# Altium schematic symbol library SparkFun.SCHLIB: 796 symbols (part 1 of 5) (continued)
## AVR-MEGA8-PSIM (continued)

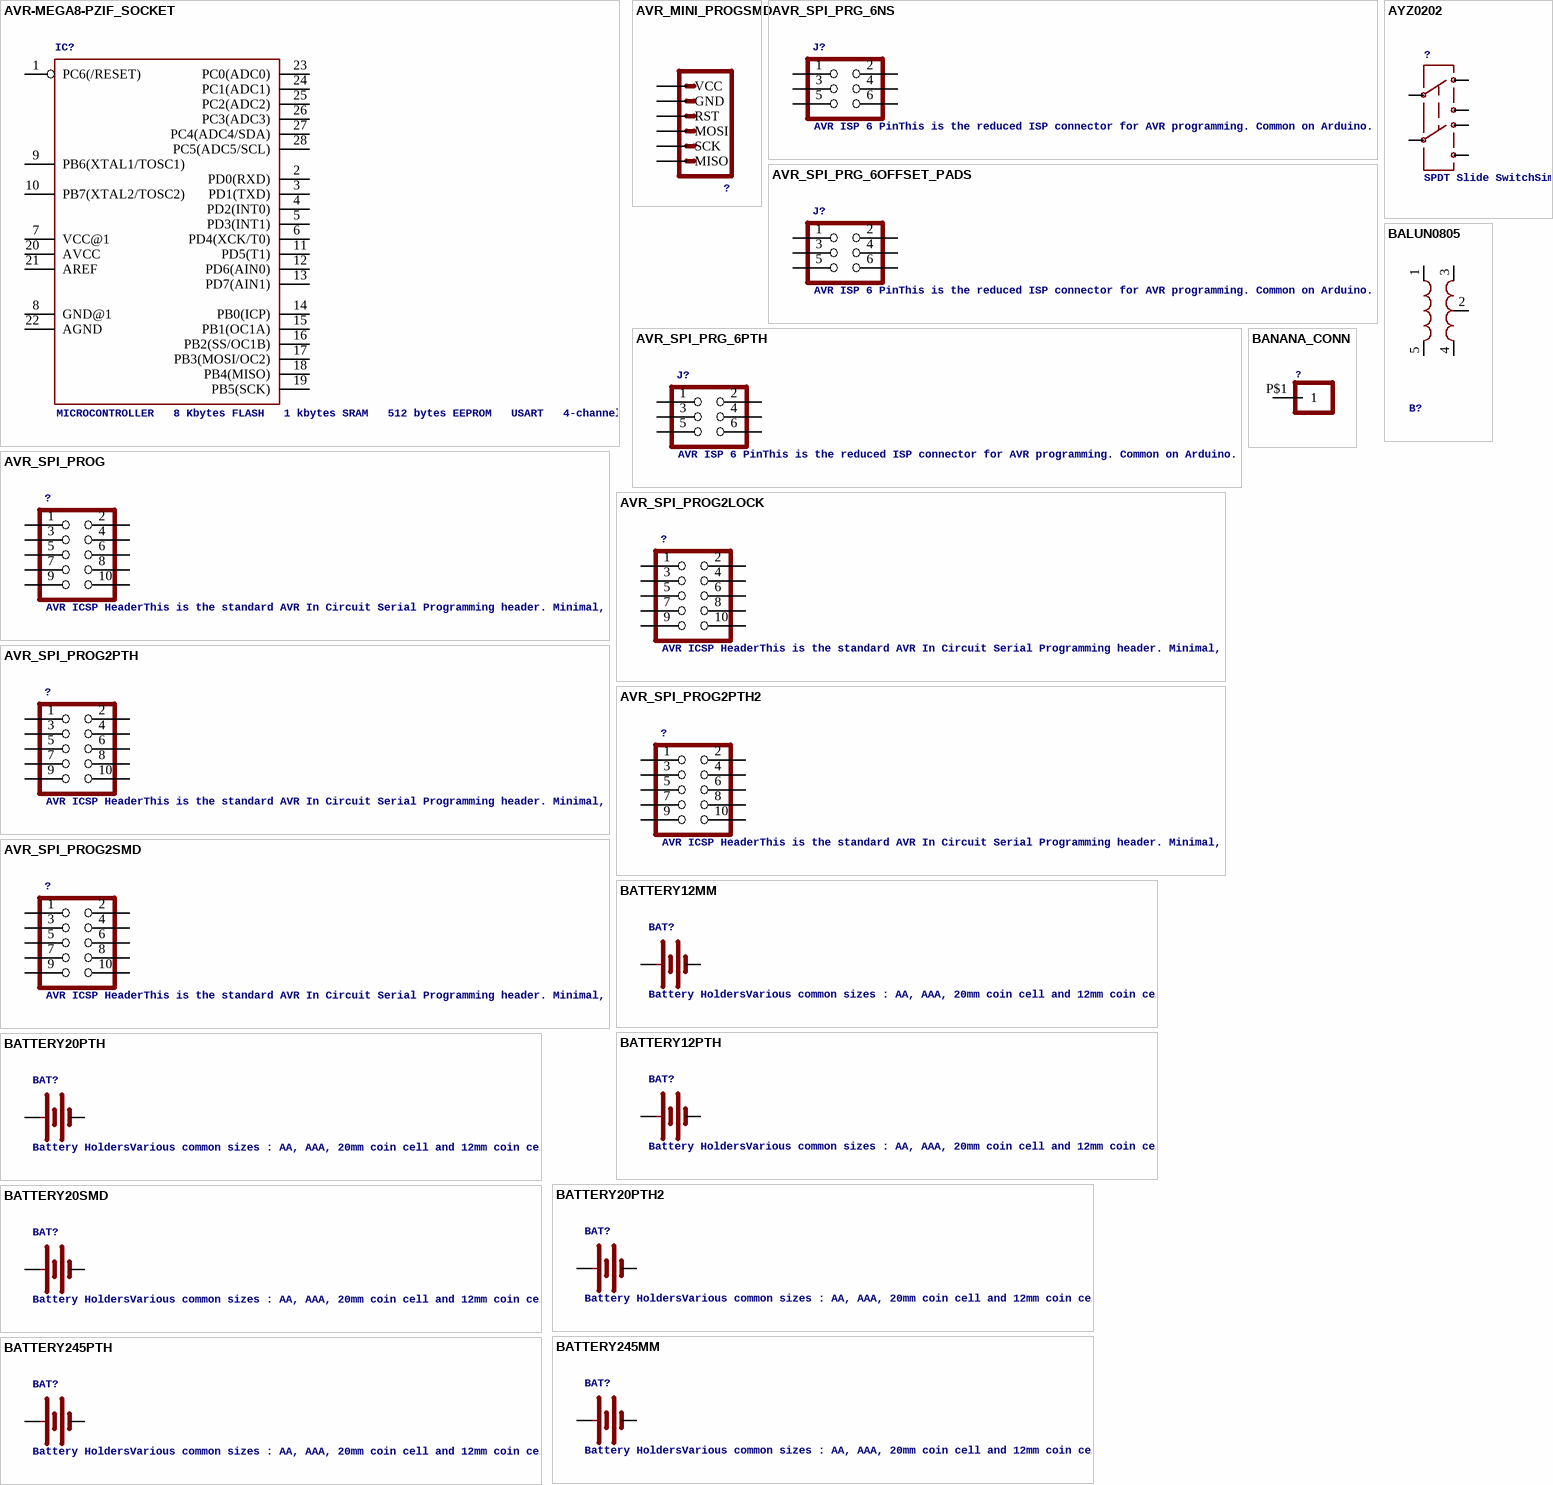
[diagram p4: symbols AVR-MEGA8-PZIF_SOCKET to BATTERY245PTH]

## AVR-MEGA8-PZIF_SOCKET
designator IC?, comment MICROCONTROLLER   8 Kbytes FLASH   1 kbytes SRAM   512 bytes EEPROM   USART   4-channel 10 bit ADC   2-channel 8 bit ADC
footprint DIL28-3-ZIF_SOCKET
pins: 1 PC6(/RESET), 2 PD0(RXD), 3 PD1(TXD), 4 PD2(INT0), 5 PD3(INT1), 6 PD4(XCK/T0), 7 VCC@1, 8 GND@1, 9 PB6(XTAL1/TOSC1), 10 PB7(XTAL2/TOSC2), 11 PD5(T1), 12 PD6(AIN0), 13 PD7(AIN1), 14 PB0(ICP), 15 PB1(OC1A), 16 PB2(SS/OC1B), 17 PB3(MOSI/OC2), 18 PB4(MISO), 19 PB5(SCK), 20 AVCC, 21 AREF, 22 AGND, 23 PC0(ADC0), 24 PC1(ADC1), 25 PC2(ADC2), 26 PC3(ADC3), 27 PC4(ADC4/SDA), 28 PC5(ADC5/SCL)

## AVR_MINI_PROGSMD
designator ?
footprint AVR_MINI_PROG
pins: 1 VCC, 2 GND, 3 RST, 4 MOSI, 5 SCK, 6 MISO

## AVR_SPI_PRG_6NS
designator J?, comment AVR ISP 6 PinThis is the reduced ISP connector for AVR programming. Common on Arduino. This footprint will take up less PCB space and can be used with a 10-pin to 6-pin adapter such as SKU: BOB-08508
footprint 2X3-NS
pins: 1, 2, 3, 4, 5, 6

## AVR_SPI_PRG_6OFFSET_PADS
designator J?, comment AVR ISP 6 PinThis is the reduced ISP connector for AVR programming. Common on Arduino. This footprint will take up less PCB space and can be used with a 10-pin to 6-pin adapter such as SKU: BOB-08508
footprint 2X3_OFFSET
pins: 1, 2, 3, 4, 5, 6

## AVR_SPI_PRG_6PTH
designator J?, comment AVR ISP 6 PinThis is the reduced ISP connector for AVR programming. Common on Arduino. This footprint will take up less PCB space and can be used with a 10-pin to 6-pin adapter such as SKU: BOB-08508
footprint 2X3
pins: 1, 2, 3, 4, 5, 6

## AVR_SPI_PROG
designator ?, comment AVR ICSP HeaderThis is the standard AVR In Circuit Serial Programming header. Minimal, but includes pin one indicator. Works with standard Olimex programmers. Also look for the 6-pin reduced version. Spark Fun Electronics SKU: PRT-00778
footprint AVR_ICSP
pins: 1, 2, 3, 4, 5, 6, 7, 8, 9, 10

## AVR_SPI_PROG2LOCK
designator ?, comment AVR ICSP HeaderThis is the standard AVR In Circuit Serial Programming header. Minimal, but includes pin one indicator. Works with standard Olimex programmers. Also look for the 6-pin reduced version. Spark Fun Electronics SKU: PRT-00778
footprint 2X5-SHROUDED_LOCK
pins: 1, 2, 3, 4, 5, 6, 7, 8, 9, 10

## AVR_SPI_PROG2PTH
designator ?, comment AVR ICSP HeaderThis is the standard AVR In Circuit Serial Programming header. Minimal, but includes pin one indicator. Works with standard Olimex programmers. Also look for the 6-pin reduced version. Spark Fun Electronics SKU: PRT-00778
footprint AVR_ICSP
pins: 1, 2, 3, 4, 5, 6, 7, 8, 9, 10

## AVR_SPI_PROG2PTH2
designator ?, comment AVR ICSP HeaderThis is the standard AVR In Circuit Serial Programming header. Minimal, but includes pin one indicator. Works with standard Olimex programmers. Also look for the 6-pin reduced version. Spark Fun Electronics SKU: PRT-00778
footprint 2X5-SHROUDED
pins: 1, 2, 3, 4, 5, 6, 7, 8, 9, 10

## AVR_SPI_PROG2SMD
designator ?, comment AVR ICSP HeaderThis is the standard AVR In Circuit Serial Programming header. Minimal, but includes pin one indicator. Works with standard Olimex programmers. Also look for the 6-pin reduced version. Spark Fun Electronics SKU: PRT-00778
footprint 2X5-SHROUDED_SMD
pins: 1, 2, 3, 4, 5, 6, 7, 8, 9, 10

## AYZ0202
designator ?, comment SPDT Slide SwitchSimple SMD single-pull double-throw slide switch. Good for  less than 350mA power switch, switching UARTs between devices, etc. Spark Fun Electronics SKU : COM-00597
footprint AYZ0202
pins: 1 3, 2, 3 1, 4 6, 5, 6 4

## BALUN0805
designator B?
footprint BALUN
pins: 1 IN, 2 GND@2, 3 OUT1, 4 OUT2, 5 GND@5

## BANANA_CONN
designator ?
footprint BANANA_CONN
pins: P$1 1

## BATTERY12MM
designator BAT?, comment Battery HoldersVarious common sizes : AA, AAA, 20mm coin cell and 12mm coin cell.
footprint BATTCON_12MM
pins: GND - (power), PWR@1 + (power)

## BATTERY12PTH
designator BAT?, comment Battery HoldersVarious common sizes : AA, AAA, 20mm coin cell and 12mm coin cell.
footprint BATTCON_12MM_PTH
pins: GND - (power), VCC@1 + (power)

## BATTERY20PTH
designator BAT?, comment Battery HoldersVarious common sizes : AA, AAA, 20mm coin cell and 12mm coin cell.
footprint BATTCOM_20MM_PTH
pins: 1 + (power), 2 - (power)

## BATTERY20PTH2
designator BAT?, comment Battery HoldersVarious common sizes : AA, AAA, 20mm coin cell and 12mm coin cell.
footprint BATTERY
pins: + (power), - (power)

## BATTERY20SMD
designator BAT?, comment Battery HoldersVarious common sizes : AA, AAA, 20mm coin cell and 12mm coin cell.
footprint BATTCON_20MM
pins: 1 + (power), 2 - (power)

## BATTERY245MM
designator BAT?, comment Battery HoldersVarious common sizes : AA, AAA, 20mm coin cell and 12mm coin cell.
footprint BATTCON_245MM
pins: 1 + (power), 2 - (power)

## BATTERY245PTH
designator BAT?, comment Battery HoldersVarious common sizes : AA, AAA, 20mm coin cell and 12mm coin cell.
footprint BATTCON_245MM_PTH
pins: 2 - (power), 3 + (power)

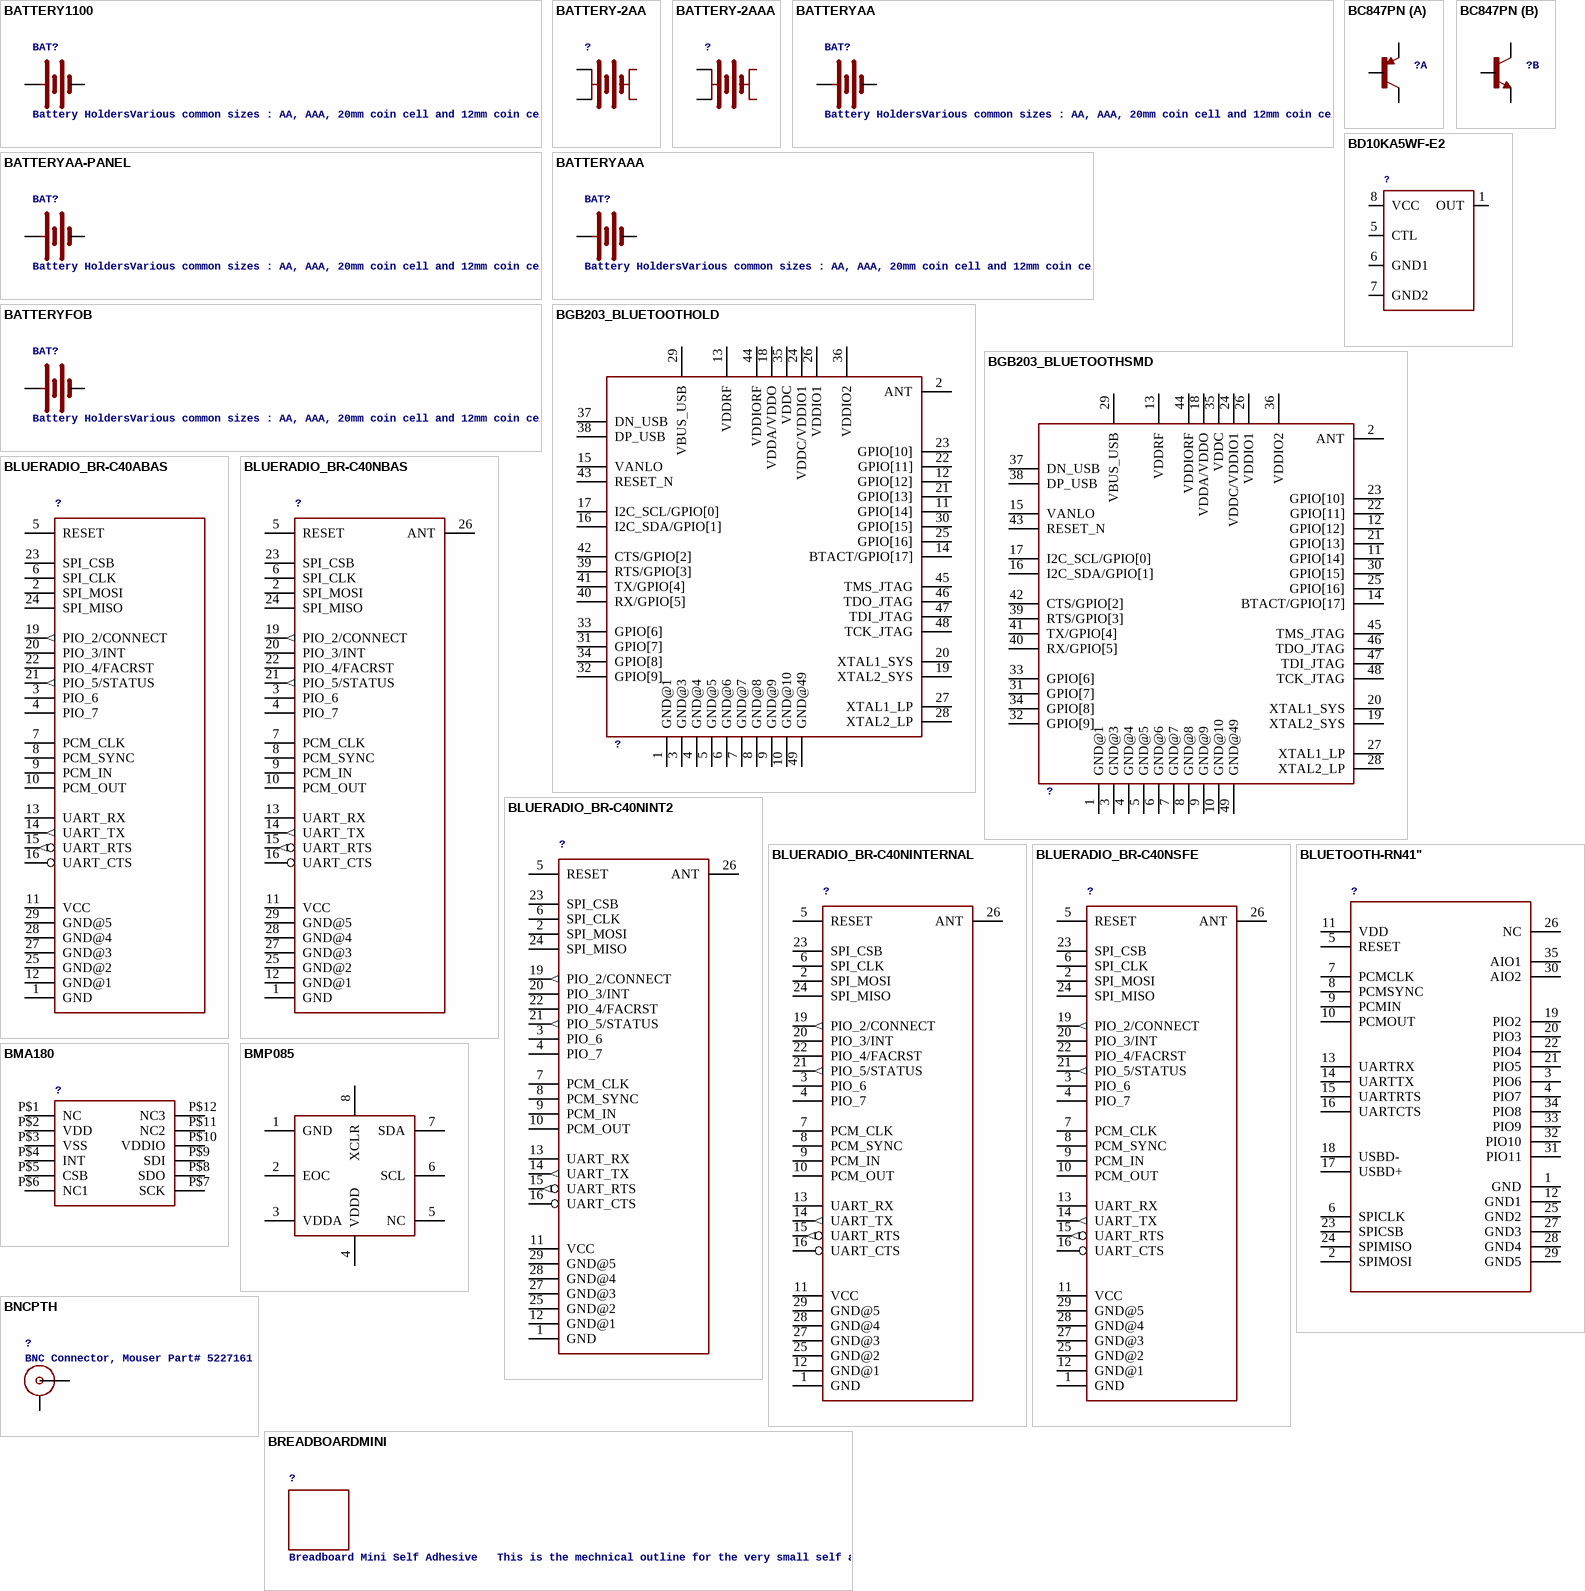
[diagram p5: symbols BATTERY1100 to BREADBOARDMINI]

## BATTERY1100
designator BAT?, comment Battery HoldersVarious common sizes : AA, AAA, 20mm coin cell and 12mm coin cell.
footprint LIPO-1100MAH
pins: + (power), - (power)

## BATTERY-2AA
designator ?
footprint BATTERY-AA
pins: GND@1 -1 (power), GND@2 -2 (power), PWR@1 +1 (power), PWR@2 +2 (power)

## BATTERY-2AAA
designator ?
footprint BATTERY-AAA
pins: GND@1 -1 (power), GND@2 -2 (power), PWR@1 +1 (power), PWR@2 +2 (power)

## BATTERYAA
designator BAT?, comment Battery HoldersVarious common sizes : AA, AAA, 20mm coin cell and 12mm coin cell.
footprint BATTERY-AA
pins: GND@1 - (power), PWR@1 + (power)

## BATTERYAA-PANEL
designator BAT?, comment Battery HoldersVarious common sizes : AA, AAA, 20mm coin cell and 12mm coin cell.
footprint BATTERY-AA-PANEL
pins: + (power), - (power)

## BATTERYAAA
designator BAT?, comment Battery HoldersVarious common sizes : AA, AAA, 20mm coin cell and 12mm coin cell.
footprint BATTERY-AAA
pins: GND@1 - (power), PWR@1 + (power)

## BATTERYFOB
designator BAT?, comment Battery HoldersVarious common sizes : AA, AAA, 20mm coin cell and 12mm coin cell.
footprint BATTERY_20MM_PTH_COMPACT
pins: 1 + (power), 2 - (power)

## BC847PN
designator ?
footprint SOT363
part A pins: 1 E, 2 B, 6 C
part B pins: 3 C, 4 E, 5 B

## BD10KA5WF-E2
designator ?
footprint SO08WIDE
pins: 1 OUT, 5 CTL, 6 GND1, 7 GND2, 8 VCC

## BGB203_BLUETOOTHOLD
designator ?
footprint BGB203_ORIGINAL
pins: 1 GND@1, 2 ANT, 3 GND@3, 4 GND@4, 5 GND@5, 6 GND@6, 7 GND@7, 8 GND@8, 9 GND@9, 10 GND@10, 11 GPIO[14], 12 GPIO[12], 13 VDDRF, 14 BTACT/GPIO[17], 15 VANLO, 16 I2C_SDA/GPIO[1], 17 I2C_SCL/GPIO[0], 18 VDDA/VDDO, 19 XTAL2_SYS, 20 XTAL1_SYS, 21 GPIO[13], 22 GPIO[11], 23 GPIO[10], 24 VDDC/VDDIO1, 25 GPIO[16], 26 VDDIO1, 27 XTAL1_LP, 28 XTAL2_LP, 29 VBUS_USB, 30 GPIO[15], 31 GPIO[7], 32 GPIO[9], 33 GPIO[6], 34 GPIO[8], 35 VDDC, 36 VDDIO2, 37 DN_USB, 38 DP_USB, 39 RTS/GPIO[3], 40 RX/GPIO[5], 41 TX/GPIO[4], 42 CTS/GPIO[2], 43 RESET_N, 44 VDDIORF, 45 TMS_JTAG, 46 TDO_JTAG, 47 TDI_JTAG, 48 TCK_JTAG, 49 GND@49

## BGB203_BLUETOOTHSMD
designator ?
footprint BGB203
pins: 1 GND@1, 2 ANT, 3 GND@3, 4 GND@4, 5 GND@5, 6 GND@6, 7 GND@7, 8 GND@8, 9 GND@9, 10 GND@10, 11 GPIO[14], 12 GPIO[12], 13 VDDRF, 14 BTACT/GPIO[17], 15 VANLO, 16 I2C_SDA/GPIO[1], 17 I2C_SCL/GPIO[0], 18 VDDA/VDDO, 19 XTAL2_SYS, 20 XTAL1_SYS, 21 GPIO[13], 22 GPIO[11], 23 GPIO[10], 24 VDDC/VDDIO1, 25 GPIO[16], 26 VDDIO1, 27 XTAL1_LP, 28 XTAL2_LP, 29 VBUS_USB, 30 GPIO[15], 31 GPIO[7], 32 GPIO[9], 33 GPIO[6], 34 GPIO[8], 35 VDDC, 36 VDDIO2, 37 DN_USB, 38 DP_USB, 39 RTS/GPIO[3], 40 RX/GPIO[5], 41 TX/GPIO[4], 42 CTS/GPIO[2], 43 RESET_N, 44 VDDIORF, 45 TMS_JTAG, 46 TDO_JTAG, 47 TDI_JTAG, 48 TCK_JTAG, 49 GND@49

## BLUERADIO_BR-C40ABAS
designator ?, comment Bluetooth SMD ModuleFootprint fully proven. Spark Fun Electronics SKU : WRL-00149  (value not drawn)
footprint BLUERADIO_BR-C40A
pins: 1 GND (power), 2 SPI_MOSI, 3 PIO_6, 4 PIO_7, 5 RESET, 6 SPI_CLK, 7 PCM_CLK, 8 PCM_SYNC, 9 PCM_IN, 10 PCM_OUT, 11 VCC, 12 GND@1 (power), 13 UART_RX, 14 UART_TX (out), 15 UART_RTS (out), 16 UART_CTS, 19 PIO_2/CONNECT (out), 20 PIO_3/INT, 21 PIO_5/STATUS (out), 22 PIO_4/FACRST, 23 SPI_CSB, 24 SPI_MISO, 25 GND@2 (power), 27 GND@3 (power), 28 GND@4 (power), 29 GND@5 (power)

## BLUERADIO_BR-C40NBAS
designator ?, comment Bluetooth SMD ModuleBR-C40A with antenna cut off. 50 Ohm antenna trace and connector required. Footprint fully proven. Spark Fun Electronics SKU : WRL-00149  (value not drawn)
footprint BLUERADIO_BR-C40N
pins: 1 GND (power), 2 SPI_MOSI, 3 PIO_6, 4 PIO_7, 5 RESET, 6 SPI_CLK, 7 PCM_CLK, 8 PCM_SYNC, 9 PCM_IN, 10 PCM_OUT, 11 VCC, 12 GND@1 (power), 13 UART_RX, 14 UART_TX (out), 15 UART_RTS (out), 16 UART_CTS, 19 PIO_2/CONNECT (out), 20 PIO_3/INT, 21 PIO_5/STATUS (out), 22 PIO_4/FACRST, 23 SPI_CSB, 24 SPI_MISO, 25 GND@2 (power), 26 ANT, 27 GND@3 (power), 28 GND@4 (power), 29 GND@5 (power)

## BLUERADIO_BR-C40NINT2
designator ?, comment Bluetooth SMD ModuleBR-C40A with antenna cut off. 50 Ohm antenna trace and connector required. Footprint fully proven. Spark Fun Electronics SKU : WRL-00149  (value not drawn)
footprint BLUETOOTH-INTERNAL-FP2
pins: 1 GND (power), 2 SPI_MOSI, 3 PIO_6, 4 PIO_7, 5 RESET, 6 SPI_CLK, 7 PCM_CLK, 8 PCM_SYNC, 9 PCM_IN, 10 PCM_OUT, 11 VCC, 12 GND@1 (power), 13 UART_RX, 14 UART_TX (out), 15 UART_RTS (out), 16 UART_CTS, 19 PIO_2/CONNECT (out), 20 PIO_3/INT, 21 PIO_5/STATUS (out), 22 PIO_4/FACRST, 23 SPI_CSB, 24 SPI_MISO, 25 GND@2 (power), 26 ANT, 27 GND@3 (power), 28 GND@4 (power), 29 GND@5 (power)

## BLUERADIO_BR-C40NINTERNAL
designator ?, comment Bluetooth SMD ModuleBR-C40A with antenna cut off. 50 Ohm antenna trace and connector required. Footprint fully proven. Spark Fun Electronics SKU : WRL-00149  (value not drawn)
footprint BLUETOOTH-INTERNAL-FP
pins: 1 GND (power), 2 SPI_MOSI, 3 PIO_6, 4 PIO_7, 5 RESET, 6 SPI_CLK, 7 PCM_CLK, 8 PCM_SYNC, 9 PCM_IN, 10 PCM_OUT, 11 VCC, 12 GND@1 (power), 13 UART_RX, 14 UART_TX (out), 15 UART_RTS (out), 16 UART_CTS, 19 PIO_2/CONNECT (out), 20 PIO_3/INT, 21 PIO_5/STATUS (out), 22 PIO_4/FACRST, 23 SPI_CSB, 24 SPI_MISO, 25 GND@2 (power), 26 ANT, 27 GND@3 (power), 28 GND@4 (power), 29 GND@5 (power)

## BLUERADIO_BR-C40NSFE
designator ?, comment Bluetooth SMD ModuleBR-C40A with antenna cut off. 50 Ohm antenna trace and connector required. Footprint fully proven. Spark Fun Electronics SKU : WRL-00149  (value not drawn)
footprint BLUETOOTH-SMD-FP
pins: 1 GND (power), 2 SPI_MOSI, 3 PIO_6, 4 PIO_7, 5 RESET, 6 SPI_CLK, 7 PCM_CLK, 8 PCM_SYNC, 9 PCM_IN, 10 PCM_OUT, 11 VCC, 12 GND@1 (power), 13 UART_RX, 14 UART_TX (out), 15 UART_RTS (out), 16 UART_CTS, 19 PIO_2/CONNECT (out), 20 PIO_3/INT, 21 PIO_5/STATUS (out), 22 PIO_4/FACRST, 23 SPI_CSB, 24 SPI_MISO, 25 GND@2 (power), 26 ANT, 27 GND@3 (power), 28 GND@4 (power), 29 GND@5 (power)

## BLUETOOTH-RN41"
designator ?
footprint RN41
pins: 1 GND, 2 SPIMOSI, 3 PIO6, 4 PIO7, 5 RESET, 6 SPICLK, 7 PCMCLK, 8 PCMSYNC, 9 PCMIN, 10 PCMOUT, 11 VDD, 12 GND1, 13 UARTRX, 14 UARTTX, 15 UARTRTS, 16 UARTCTS, 17 USBD+, 18 USBD-, 19 PIO2, 20 PIO3, 21 PIO5, 22 PIO4, 23 SPICSB, 24 SPIMISO, 25 GND2, 26 NC, 27 GND3, 28 GND4, 29 GND5, 30 AIO2, 31 PIO11, 32 PIO10, 33 PIO9, 34 PIO8, 35 AIO1

## BMA180
designator ?
footprint LGA12
pins: P$1 NC, P$2 VDD, P$3 VSS, P$4 INT, P$5 CSB, P$6 NC1, P$7 SCK, P$8 SDO, P$9 SDI, P$10 VDDIO, P$11 NC2, P$12 NC3

## BMP085
designator ?
footprint BMP085
pins: 1 GND, 2 EOC, 3 VDDA, 4 VDDD, 5 NC, 6 SCL, 7 SDA, 8 XCLR

## BNCPTH
designator ?, comment BNC Connector, Mouser Part# 5227161
footprint BNC
pins: GND, S OUT

## BREADBOARDMINI
designator ?, comment Breadboard Mini Self Adhesive   This is the mechnical outline for the very small self adhesive breadboard from SparkFun Electronics. Good for very small proto areas. SKU : PRT-07916
footprint BREADBOARD-MINI

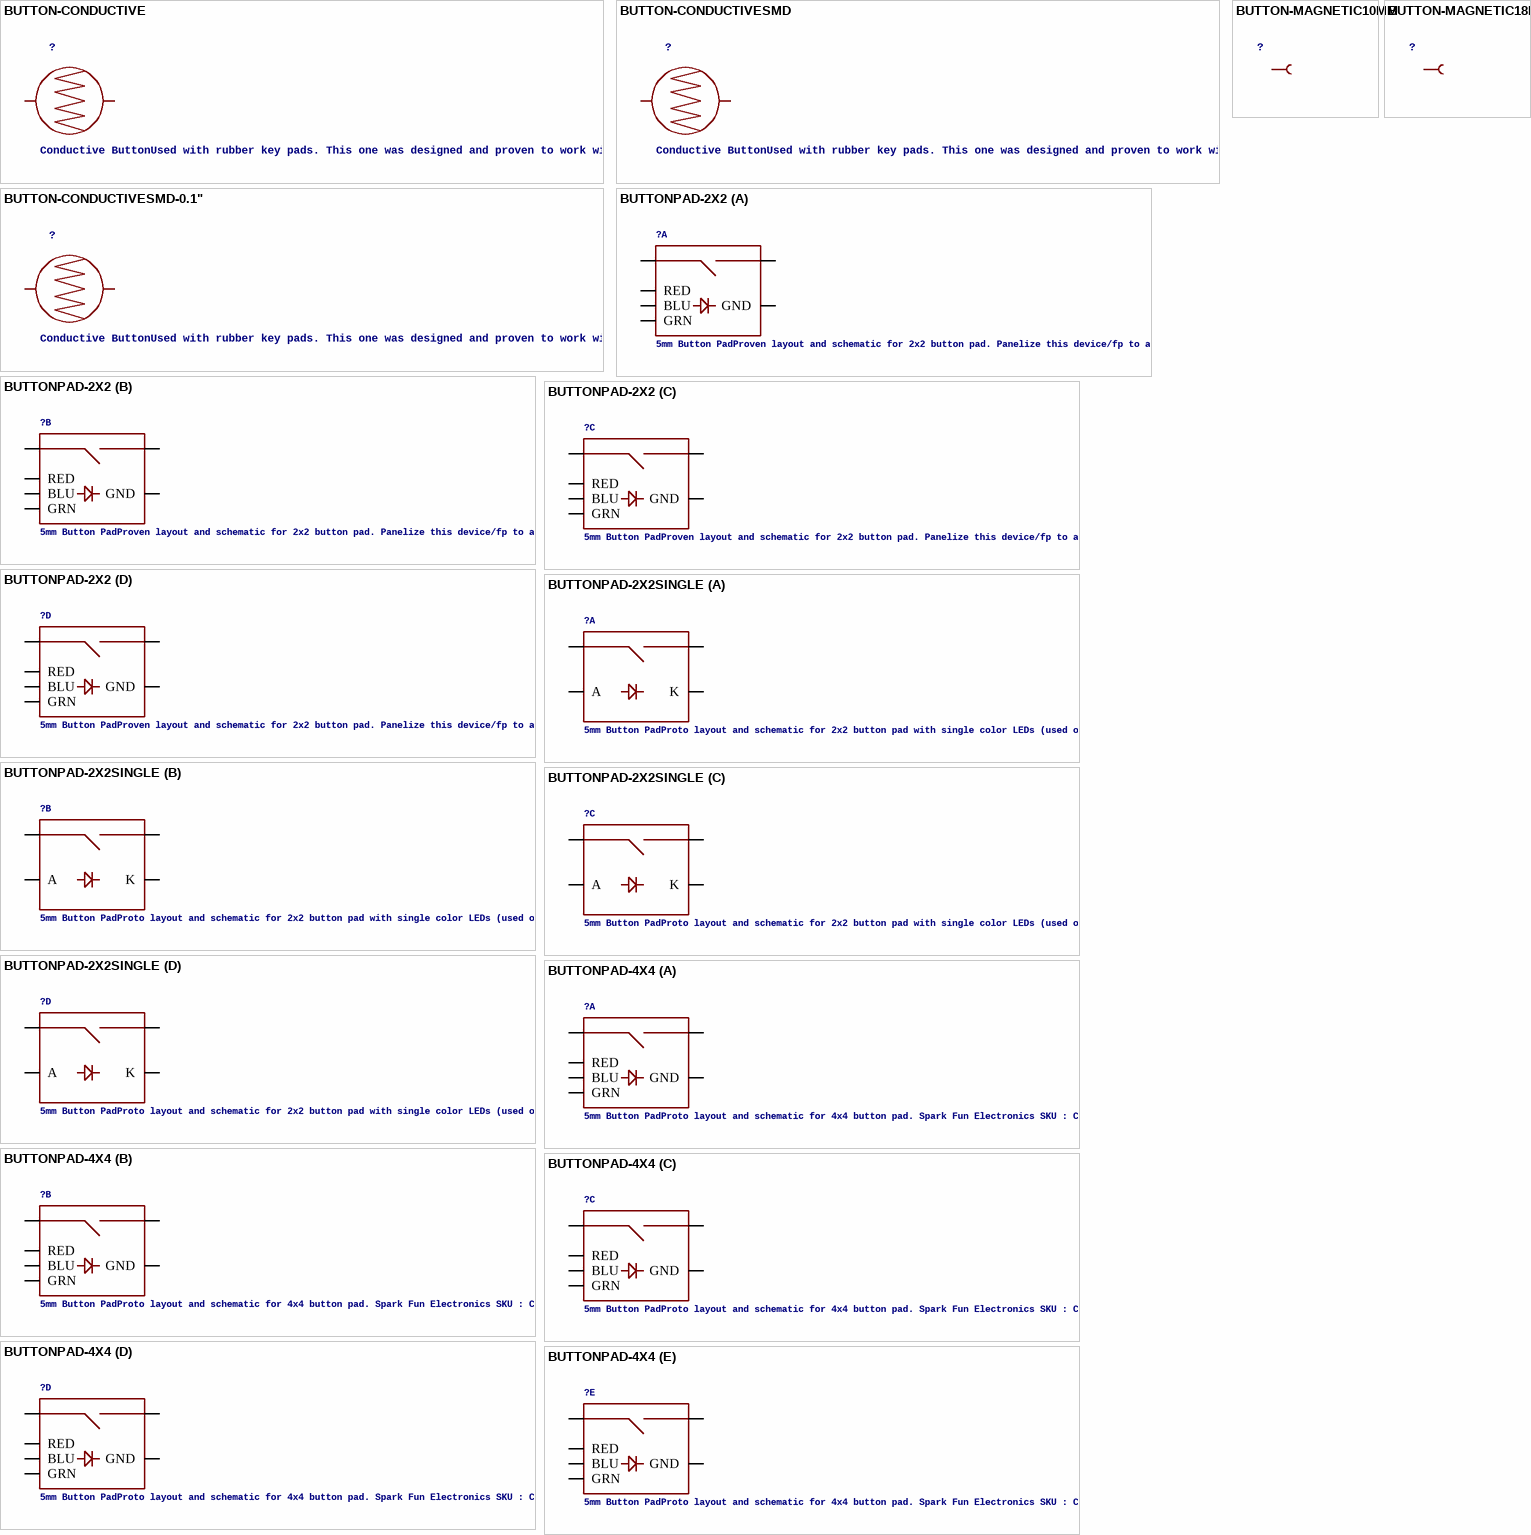
[diagram p6: symbols BUTTON-CONDUCTIVE to BUTTONPAD-4X4]

## BUTTON-CONDUCTIVE
designator ?, comment Conductive ButtonUsed with rubber key pads. This one was designed and proven to work with the PolyCase Key FOB enclosures.
footprint BUTTON-CONDUCTIVE-MINI
pins: 1, 2

## BUTTON-CONDUCTIVESMD
designator ?, comment Conductive ButtonUsed with rubber key pads. This one was designed and proven to work with the PolyCase Key FOB enclosures.
footprint BUTTON-CONDUCTIVE
pins: 1, 2

## BUTTON-CONDUCTIVESMD-0.1"
designator ?, comment Conductive ButtonUsed with rubber key pads. This one was designed and proven to work with the PolyCase Key FOB enclosures.
footprint BUTTON-CONDUCTIVE-0.1
pins: 1, 2

## BUTTON-MAGNETIC10MM
designator ?
footprint BUTTON-10MM
pins: 1

## BUTTON-MAGNETIC18MM
designator ?
footprint BUTTON-18MM
pins: 1

## BUTTONPAD-2X2
designator ?, comment 5mm Button PadProven layout and schematic for 2x2 button pad. Panelize this device/fp to a 4x4 pad if needed. Spark Fun Electronics SKU : COM-07835. Compatible common cathode tri-color LED SKU : COM-00105
footprint BUTTONPAD-2X2
part A pins: BLU1 BLU, GND1 GND, GRN1 GRN, RED1 RED, SIG1, SIG2
part B pins: BLU2 BLU, GND2 GND, GRN2 GRN, RED2 RED, SIG3 SIG1, SIG4 SIG2
part C pins: BLU3 BLU, GND3 GND, GRN3 GRN, RED3 RED, SIG5 SIG1, SIG6 SIG2
part D pins: BLU4 BLU, GND4 GND, GRN4 GRN, RED4 RED, SIG7 SIG1, SIG8 SIG2

## BUTTONPAD-2X2SINGLE
designator ?, comment 5mm Button PadProto layout and schematic for 2x2 button pad with single color LEDs (used on Simon board). Panelize this device/fp to a 4x4 pad if needed. Any single-color 5mm LED should be compatible. Spark Fun Electronics SKU : COM-07835.
footprint BUTTONPAD-2X2SINGLE
part A pins: A1 A, K1 K, SIG1, SIG2
part B pins: A2 A, K2 K, SIG3 SIG1, SIG4 SIG2
part C pins: A3 A, K3 K, SIG5 SIG1, SIG6 SIG2
part D pins: A4 A, K4 K, SIG7 SIG1, SIG8 SIG2

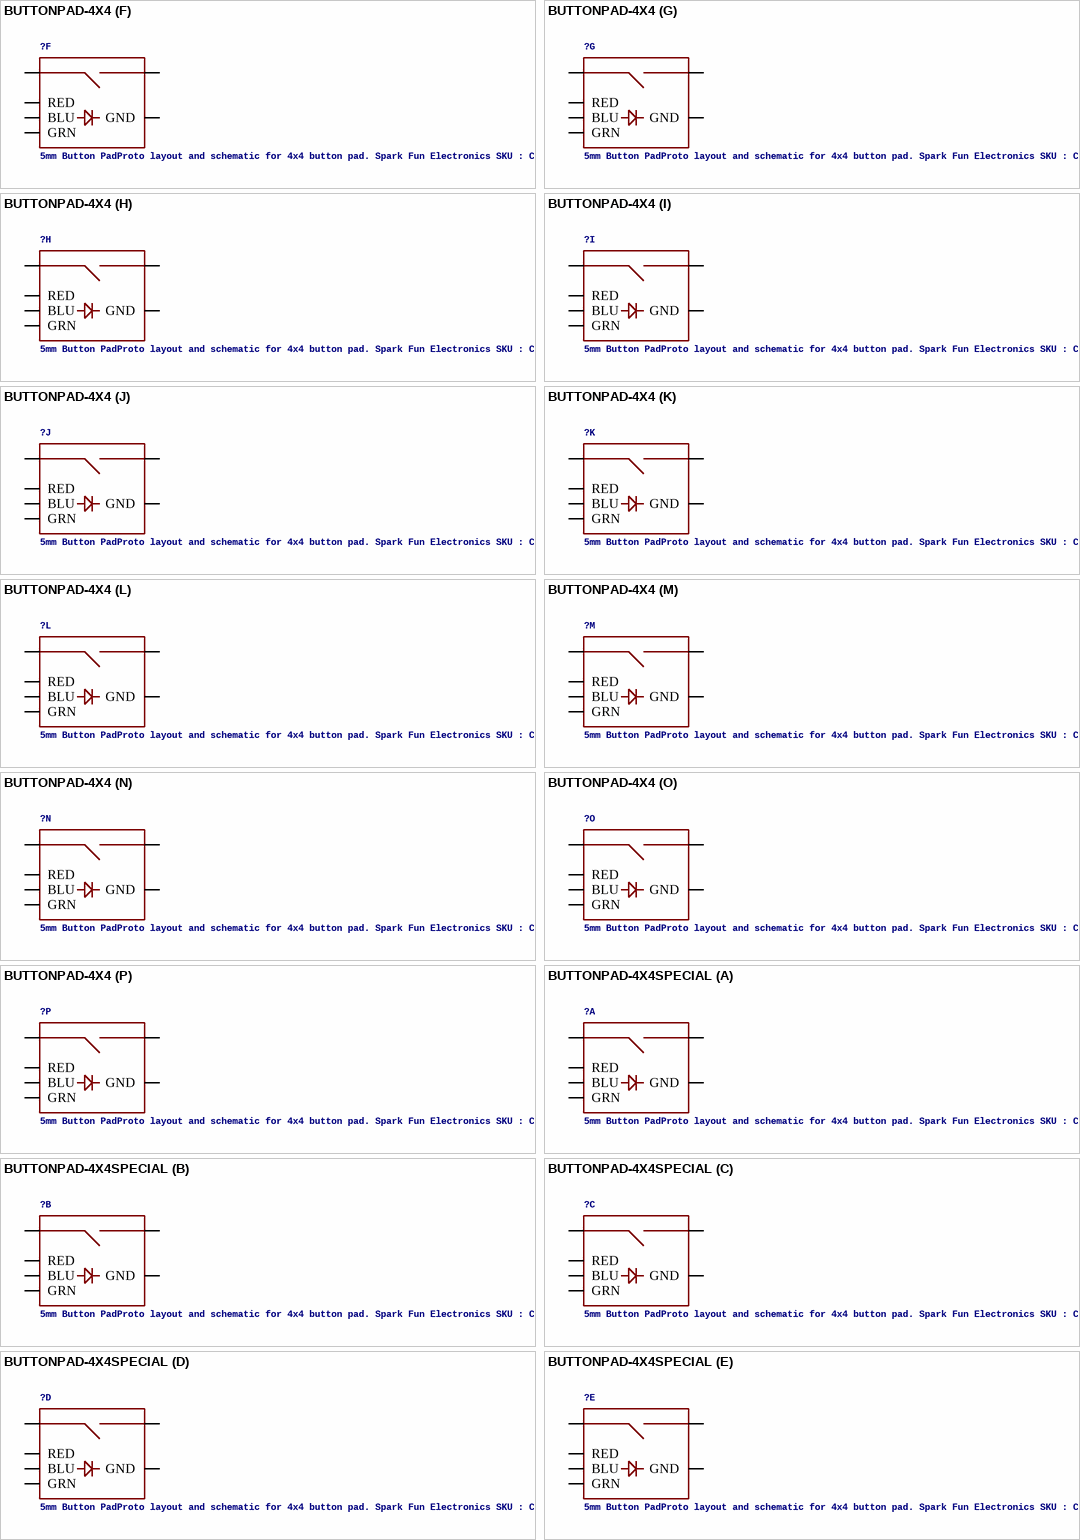
[diagram p7: symbols BUTTONPAD-4X4 to BUTTONPAD-4X4SPECIAL]

## BUTTONPAD-4X4
designator ?, comment 5mm Button PadProto layout and schematic for 4x4 button pad. Spark Fun Electronics SKU : COM-07835. Compatible common cathode tri-color LED SKU : COM-00105
footprint BUTTONPAD-4X4
part A pins: BLU0 BLU, GND0 GND, GRN0 GRN, RED0 RED, SIG0 SIG1, SIG1 SIG2
part B pins: BLU1 BLU, GND1 GND, GRN1 GRN, RED1 RED, SIG2 SIG1, SIG3 SIG2
part C pins: BLU2 BLU, GND2 GND, GRN2 GRN, RED2 RED, SIG4 SIG1, SIG5 SIG2
part D pins: BLU3 BLU, GND3 GND, GRN3 GRN, RED3 RED, SIG6 SIG1, SIG7 SIG2
part E pins: BLU4 BLU, GND4 GND, GRN4 GRN, RED4 RED, SIG8 SIG1, SIG9 SIG2
part F pins: BLU5 BLU, GND5 GND, GRN6 GRN, RED5 RED, SIG10 SIG1, SIG11 SIG2
part G pins: BLU6 BLU, GND6 GND, GRN5 GRN, RED6 RED, SIG12 SIG1, SIG13 SIG2
part H pins: BLU7 BLU, GND7 GND, GRN7 GRN, RED7 RED, SIG14 SIG1, SIG15 SIG2
part I pins: BLU8 BLU, GND8 GND, GRN8 GRN, RED8 RED, SIG16 SIG1, SIG17 SIG2
part J pins: BLU9 BLU, GND9 GND, GRN9 GRN, RED9 RED, SIG18 SIG1, SIG19 SIG2
part K pins: BLU10 BLU, GND10 GND, GRN10 GRN, RED10 RED, SIG20 SIG1, SIG21 SIG2
part L pins: BLU11 BLU, GND11 GND, GRN11 GRN, RED11 RED, SIG22 SIG1, SIG23 SIG2
part M pins: BLU12 BLU, GND12 GND, GRN12 GRN, RED12 RED, SIG24 SIG1, SIG25 SIG2
part N pins: BLU13 BLU, GND13 GND, GRN13 GRN, RED13 RED, SIG26 SIG1, SIG27 SIG2
part O pins: BLU14 BLU, GND14 GND, GRN14 GRN, RED14 RED, SIG28 SIG1, SIG29 SIG2
part P pins: BLU15 BLU, GND15 GND, GRN15 GRN, RED15 RED, SIG30 SIG1, SIG31 SIG2
